# Altium footprint library Connectors.PcbLib: 117 footprints (part 1 of 8)
Each footprint in its own frame and in the unit in brackets; x right, y up, seen from the top. Pads: shape width x height; smd on the part's side, far side on the other; paste and mask are expansions set on the pad; w line width, h text height; cw(c..) or ccw(c..) is an arc to the next point about the centre after c.
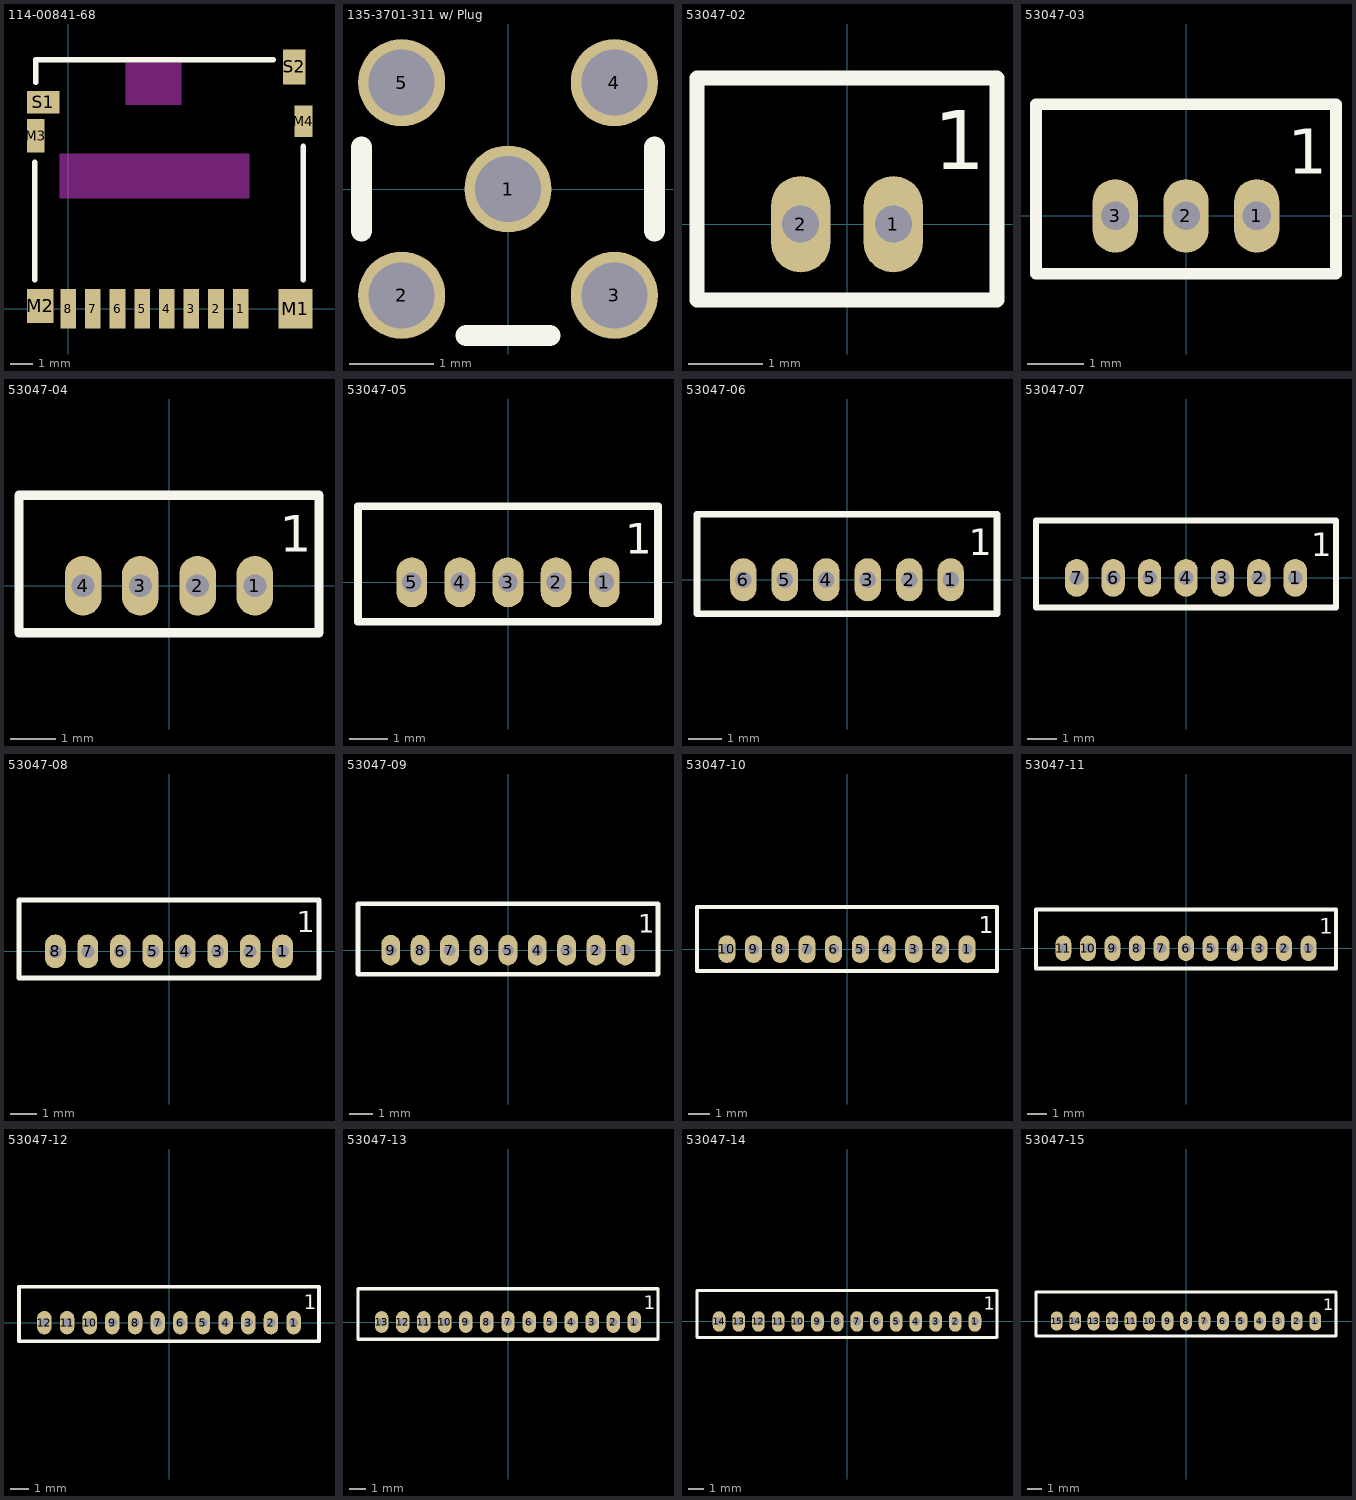
[diagram p0: the footprints below, top view; thin cyan lines are the x and y axes]

## 114-00841-68 [mm] "Amphenol SD Card Socket"
pads (14):
  rect 0.7x1.75 smd: 1(7.7,0) 2(6.6,0) 3(5.5,0) 4(4.4,0) 5(3.3,0) 6(2.2,0) 7(1.1,0) 8(0,0)
  rect 1.5x1.75 smd: M1(10.15,0)
  rect 1.2x1.5 smd: M2(-1.25,0.125)
  rect 0.8x1.5 smd: M3(-1.45,7.725)
  rect 0.8x1.4 smd: M4(10.5,8.375)
  rect 1.45x1 smd: S1(-1.125,9.225)
  rect 1x1.55 smd: S2(10.1,10.8)
Top Layer keep-out:
  rectangle: -0.4,4.925 8.1,6.925
  rectangle: 2.55,9.1 5.05,11
Top Overlay:
  lines w0.254: -1.5,1.3 -1.5,6.55 ; -1.45,10.125 -1.45,11.125 9.15,11.125 ; 10.5,1.3 10.5,7.25
3D body "1140084168-revB.stp": height 1.55, standoff -0.05, extent -1.5,-0.45 10.52,11.05
3D body "SW3dPS-Micro_SD.STEP": height 1.65, standoff 0.67, extent -1.2,-4.675 9.8,10.325

## 135-3701-311 w/ Plug [mil] "CONN MMCX JACK R/A 50 OHM PCB"
height 143
pads (5):
  round 41 hole 31 paste+0 mask+0: 1(0,0) 2(-50,-50) 3(50,-50) 4(50,50) 5(-50,50)
Top Overlay:
  lines w10: -68.9,-19.68 -68.9,19.68 ; -19.68,-68.9 19.68,-68.9 ; 68.9,-19.68 68.9,19.68
3D body "135-3701-311_320.stp": height 142.5, standoff -67.5, extent -68,-68 68,188
3D body "SW3dPS-j0411.STEP": height 144.41, standoff 4.41, extent -69.99,81.18 70.01,584.18

## 53047-02 [mm]
pads (2):
  oval 0.8x1.3 / inner round 0.8 / far side oval 0.8x1.3 hole 0.5 paste-2: 1(0.625,0) 2(-0.625,0)
Top Overlay:
  lines w0.203: -2.025,-1.025 -2.025,1.975 2.025,1.975 2.025,-1.025 -2.025,-1.025
  text "1" at 1.173,0.742 h0.8
3D body "530470210.stp": height 4.22, standoff -2.18, extent -2.125,-1.125 2.125,2.075

## 53047-03 [mm]
pads (3):
  oval 0.8x1.3 / inner round 0.8 / far side oval 0.8x1.3 hole 0.5 paste-2: 1(1.25,0) 2(0,0) 3(-1.25,0)
Top Overlay:
  lines w0.203: -2.65,-1.025 -2.65,1.975 2.65,1.975 2.65,-1.025 -2.65,-1.025
  text "1" at 1.798,0.742 h0.8
3D body "530470310.stp": height 4.22, standoff -2.18, extent -2.75,-1.125 2.75,2.075

## 53047-04 [mm]
pads (4):
  oval 0.8x1.3 / inner round 0.8 / far side oval 0.8x1.3 hole 0.5 paste-2: 1(1.875,0) 2(0.625,0) 3(-0.625,0) 4(-1.875,0)
Top Overlay:
  lines w0.203: -3.275,-1.025 3.275,-1.025 3.275,1.975 -3.275,1.975 -3.275,-1.025
  text "1" at 2.423,0.742 h0.8
3D body "530470410.stp": height 4.22, standoff -2.18, extent -3.375,-1.125 3.375,2.075

## 53047-05 [mm]
pads (5):
  oval 0.8x1.3 / inner round 0.8 / far side oval 0.8x1.3 hole 0.5 paste-2: 1(2.5,0) 2(1.25,0) 3(0,0) 4(-1.25,0) 5(-2.5,0)
Top Overlay:
  lines w0.203: -3.9,-1.025 -3.9,1.975 3.9,1.975 3.9,-1.025 -3.9,-1.025
  text "1" at 3.048,0.742 h0.8
3D body "530470510.stp": height 4.22, standoff -2.18, extent -4,-1.125 4,2.075

## 53047-06 [mm]
pads (6):
  oval 0.8x1.3 / inner round 0.8 / far side oval 0.8x1.3 hole 0.5 paste-2: 1(3.125,0) 2(1.875,0) 3(0.625,0) 4(-0.625,0) 5(-1.875,0) 6(-3.125,0)
Top Overlay:
  lines w0.203: -4.525,-1.025 4.525,-1.025 4.525,1.975 -4.525,1.975 -4.525,-1.025
  text "1" at 3.673,0.742 h0.8
3D body "530470610.stp": height 4.22, standoff -2.18, extent -4.625,-1.125 4.625,2.075

## 53047-07 [mm]
pads (7):
  oval 0.8x1.3 / inner round 0.8 / far side oval 0.8x1.3 hole 0.5 paste-2: 1(3.75,0) 2(2.5,0) 3(1.25,0) 4(0,0) 5(-1.25,0) 6(-2.5,0) 7(-3.75,0)
Top Overlay:
  lines w0.203: -5.15,-1.025 5.15,-1.025 5.15,1.975 -5.15,1.975 -5.15,-1.025
  text "1" at 4.298,0.742 h0.8
3D body "530470710.stp": height 4.22, standoff -2.18, extent -5.25,-1.125 5.25,2.075

## 53047-08 [mm]
pads (8):
  oval 0.8x1.3 / inner round 0.8 / far side oval 0.8x1.3 hole 0.5 paste-5: 1(4.375,0) 2(3.125,0) 3(1.875,0) 4(0.625,0) 5(-0.625,0) 6(-1.875,0) 7(-3.125,0) 8(-4.375,0)
Top Overlay:
  lines w0.203: -5.775,-1.025 5.775,-1.025 5.775,1.975 -5.775,1.975 -5.775,-1.025
  text "1" at 4.923,0.742 h0.8
3D body "530470810.stp": height 4.22, standoff -2.18, extent -5.875,-1.125 5.875,2.075

## 53047-09 [mm]
pads (9):
  oval 0.8x1.3 / inner round 0.8 / far side oval 0.8x1.3 hole 0.5 paste-5: 1(5,0) 2(3.75,0) 3(2.5,0) 4(1.25,0) 5(0,0) 6(-1.25,0) 7(-2.5,0) 8(-3.75,0) 9(-5,0)
Top Overlay:
  lines w0.203: -6.4,-1.025 6.4,-1.025 6.4,1.975 -6.4,1.975 -6.4,-1.025
  text "1" at 5.548,0.742 h0.8
3D body "530470910.stp": height 4.22, standoff -2.18, extent -6.5,-1.125 6.5,2.075

## 53047-10 [mm]
pads (10):
  oval 0.8x1.3 / inner round 0.8 / far side oval 0.8x1.3 hole 0.5 paste-5: 1(5.625,0) 2(4.375,0) 3(3.125,0) 4(1.875,0) 5(0.625,0) 6(-0.625,0) 7(-1.875,0) 8(-3.125,0) 9(-4.375,0) 10(-5.625,0)
Top Overlay:
  lines w0.203: -7.025,-1.025 -7.025,1.975 7.025,1.975 7.025,-1.025 -7.025,-1.025
  text "1" at 6.173,0.742 h0.8
3D body "530471010.stp": height 4.22, standoff -2.18, extent -7.125,-1.125 7.125,2.075

## 53047-11 [mm]
pads (11):
  oval 0.8x1.3 / inner round 0.8 / far side oval 0.8x1.3 hole 0.5 paste-2: 1(6.25,0) 2(5,0) 3(3.75,0) 4(2.5,0) 5(1.25,0) 6(0,0) 7(-1.25,0) 8(-2.5,0) 9(-3.75,0) 10(-5,0) 11(-6.25,0)
Top Overlay:
  lines w0.203: -7.65,-1.025 -7.65,1.975 7.65,1.975 7.65,-1.025 -7.65,-1.025
  text "1" at 6.798,0.742 h0.8
3D body "530471110.stp": height 4.22, standoff -2.18, extent -7.75,-1.125 7.75,2.075

## 53047-12 [mm]
pads (12):
  oval 0.8x1.3 / inner round 0.8 / far side oval 0.8x1.3 hole 0.5 paste-5: 1(6.875,0) 2(5.625,0) 3(4.375,0) 4(3.125,0) 5(1.875,0) 6(0.625,0) 7(-0.625,0) 8(-1.875,0) 9(-3.125,0) 10(-4.375,0) 11(-5.625,0) 12(-6.875,0)
Top Overlay:
  lines w0.203: -8.275,-1.025 8.275,-1.025 8.275,1.975 -8.275,1.975 -8.275,-1.025
  text "1" at 7.423,0.742 h0.8
3D body "530471210.stp": height 4.22, standoff -2.18, extent -8.375,-1.125 8.375,2.075

## 53047-13 [mm]
pads (13):
  oval 0.8x1.3 / inner round 0.8 / far side oval 0.8x1.3 hole 0.5 paste-2: 1(7.5,0) 2(6.25,0) 3(5,0) 4(3.75,0) 5(2.5,0) 6(1.25,0) 7(0,0) 8(-1.25,0) 9(-2.5,0) 10(-3.75,0) 11(-5,0) 12(-6.25,0) 13(-7.5,0)
Top Overlay:
  lines w0.203: -8.9,-1.025 -8.9,1.975 8.9,1.975 8.9,-1.025 -8.9,-1.025
  text "1" at 8.048,0.742 h0.8
3D body "530471310.stp": height 4.21, standoff -2.19, extent -9,-1.131 9,2.069

## 53047-14 [mm]
pads (14):
  oval 0.8x1.3 / inner round 0.8 / far side oval 0.8x1.3 hole 0.5 paste-5: 1(8.125,0) 2(6.875,0) 3(5.625,0) 4(4.375,0) 5(3.125,0) 6(1.875,0) 7(0.625,0) 8(-0.625,0) 9(-1.875,0) 10(-3.125,0) 11(-4.375,0) 12(-5.625,0) 13(-6.875,0) 14(-8.125,0)
Top Overlay:
  lines w0.203: -9.525,-1.025 -9.525,1.975 9.525,1.975 9.525,-1.025 -9.525,-1.025
  text "1" at 8.673,0.742 h0.8
3D body "530471410.stp": height 4.21, standoff -2.19, extent -9.625,-1.131 9.625,2.069

## 53047-15 [mm]
pads (15):
  oval 0.8x1.3 / inner round 0.8 / far side oval 0.8x1.3 hole 0.5 paste-2: 1(8.75,0) 2(7.5,0) 3(6.25,0) 4(5,0) 5(3.75,0) 6(2.5,0) 7(1.25,0) 8(0,0) 9(-1.25,0) 10(-2.5,0) 11(-3.75,0) 12(-5,0) 13(-6.25,0) 14(-7.5,0) 15(-8.75,0)
Top Overlay:
  lines w0.203: -10.15,-1.025 10.15,-1.025 10.15,1.975 -10.15,1.975 -10.15,-1.025
  text "1" at 9.298,0.742 h0.8
3D body "530471510.stp": height 4.21, standoff -2.19, extent -10.25,-1.131 10.25,2.069